# Altium footprint library elk-pi-Sika_revb.PcbLib: 102 footprints (part 2 of 7)
Each footprint in its own frame and in the unit in brackets; x right, y up, seen from the top. Pads: shape width x height; smd on the part's side, far side on the other; paste and mask are expansions set on the pad; w line width, h text height; cw(c..) or ccw(c..) is an arc to the next point about the centre after c.
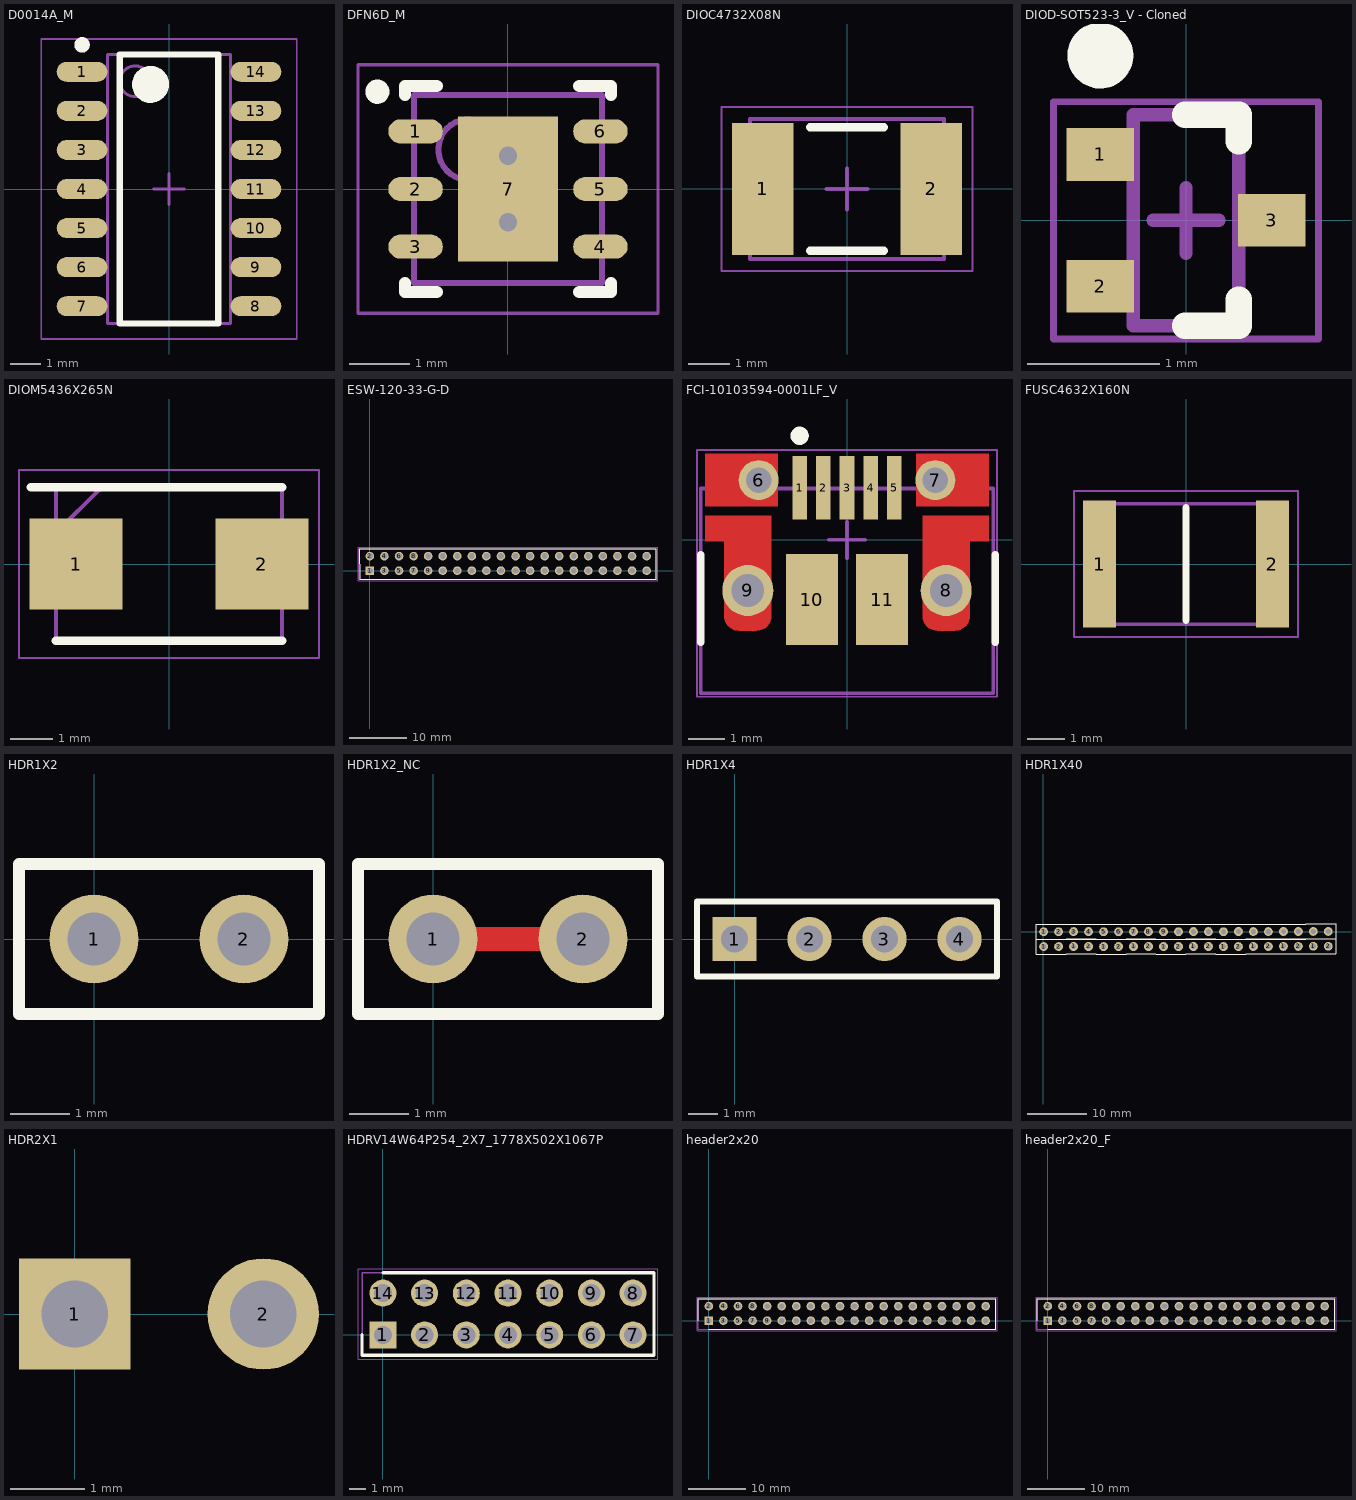
[diagram p1: the footprints below, top view; thin cyan lines are the x and y axes]

## D0014A_M [mm] "SOIC, 14-Leads, Body 8.75x4mm, Pitch 1.27mm, IPC Low Density"
height 1.75
pads (14):
  oval 1.65x0.65 smd: 1(-2.825,3.81) 2(-2.825,2.54) 3(-2.825,1.27) 4(-2.825,0) 5(-2.825,-1.27) 6(-2.825,-2.54) 7(-2.825,-3.81) 8(2.825,-3.81) 9(2.825,-2.54) 10(2.825,-1.27) 11(2.825,0) 12(2.825,1.27) 13(2.825,2.54) 14(2.825,3.81)
Top Overlay:
  circle w0.6: c-0.6,3.4 r0.3
  circle w0.25: c-2.825,4.685 r0.125
  lines w0.2: -1.6,-4.375 1.6,-4.375 1.6,4.375 -1.6,4.375 -1.6,-4.375
Mechanical 13:
  circle w0.1: c-1.1,3.5 r0.5
  lines w0.1: -2,-4.375 2,-4.375 2,4.375 -2,4.375 -2,-4.375
Mechanical 15:
  lines w0.05: -4.15,-4.875 4.15,-4.875 4.15,4.875 -4.15,4.875 -4.15,-4.875
  lines w0.1: -0.5,0 0.5,0 ; 0,-0.5 0,0.5
3D body "SOIC-14akaD0014AakaM14A.stp": height 1.59, standoff -0.01, extent -3.023,-4.318 3.022,4.318

## DFN6D_M [mm]
pads (7):
  oval 0.9x0.4 smd: 1(-1.525,0.95) 2(-1.525,0) 3(-1.525,-0.95) 4(1.525,-0.95) 5(1.525,0) 6(1.525,0.95)
  rect 1.65x2.4 smd: 7(0,0)
via 0,0.55 diameter 0.7 hole 0.3
via 0,-0.55 diameter 0.7 hole 0.3
Top Overlay:
  circle w0.2: c-2.156,1.605 r0.1
  lines w0.2: -1.7,-1.55 -1.7,-1.7 -1.175,-1.7 ; -1.7,1.55 -1.7,1.7 -1.175,1.7 ; 1.175,-1.7 1.7,-1.7 1.7,-1.55 ; 1.175,1.7 1.7,1.7 1.7,1.55
Mechanical 13:
  circle w0.1: c-0.65,0.65 r0.5
  lines w0.1: -1.55,-1.55 -1.55,1.55 1.55,1.55 1.55,-1.55 -1.55,-1.55
Mechanical 15:
  lines w0.05: -2.475,-2.05 -2.475,2.05 2.475,2.05 2.475,-2.05 -2.475,-2.05
  lines w0.1: -0.5,0 0.5,0 ; 0,-0.5 0,0.5
3D body: height 0.95, standoff 0, extent -1.55,-1.55 1.55,1.55

## DIOC4732X08N [mm] "Chip Diode, 2-Leads, Body 4,73x3,24mm, IPC Medium Density"
height 0.85
pads (2):
  rect 1.5x3.2 smd: 1(-2.05,0) 2(2.05,0)
Top Overlay:
  lines w0.2: -0.9,-1.5 0.9,-1.5 ; -0.9,1.5 0.9,1.5
Mechanical 13:
  lines w0.1: -2.365,-1.705 -2.365,1.705 2.365,1.705 2.365,-1.705 -2.365,-1.705
Mechanical 15:
  lines w0.05: -3.05,-2 -3.05,2 3.05,2 3.05,-2 -3.05,-2
  lines w0.1: -0.5,0 0.5,0 ; 0,-0.5 0,0.5
3D body: height 0.85, standoff 0, extent -2.015,-1.705 2.015,1.705
3D body: height 0.85, standoff 0, extent -2.365,-1.705 -2.015,1.705
3D body: height 0.85, standoff 0, extent 2.015,-1.705 2.365,1.705

## DIOD-SOT523-3_V - Cloned [mm] "SOT523, 3-Leads, Body 1.6x0.8mm, Pitch 0.50mm"
height 0.862
pads (3):
  rect 0.51x0.4 smd: 1(-0.65,0.5) 2(-0.65,-0.5) 3(0.65,0)
Top Overlay:
  circle w0.25: c-0.65,1.25 r0.125
  lines w0.2: -0.008,-0.8 0.4,-0.8 0.4,-0.6 ; -0.008,0.8 0.4,0.8 0.4,0.6
Mechanical 13:
  lines w0.1: -0.4,-0.8 0.4,-0.8 0.4,0.8 -0.4,0.8 -0.4,-0.8
Mechanical 15:
  lines w0.05: -1.005,-0.9 1.005,-0.9 1.005,0.9 -1.005,0.9 -1.005,-0.9
  lines w0.1: -0.25,0 0.25,0 ; 0,-0.25 0,0.25
3D body: height 0.86, standoff 0, extent -0.4,-0.8 0.4,0.8

## DIOM5436X265N [mm]
pads (2):
  rect 2.2x2.15 smd: 1(-2.2,0) 2(2.2,0)
Top Overlay:
  lines w0.2: -3.275,1.812 2.675,1.812 ; -2.675,-1.812 2.675,-1.812
Mechanical 15:
  lines w0.1: -2.675,0.738 -1.6,1.812 ; -2.675,-1.812 -2.675,1.812 2.675,1.812 2.675,-1.812 -2.675,-1.812
Mechanical 20:
  lines w0.05: -3.55,-2.225 -3.55,2.225 3.55,2.225 3.55,-2.225 -3.55,-2.225

## ESW-120-33-G-D [mm]
pads (40):
  rect 1.5x1.5 / inner round 1.5 / far side rect 1.5x1.5 hole 1: 1(0,0)
  round 1.5 hole 1: 2(0,2.54) 3(2.54,0) 4(2.54,2.54) 5(5.08,0) 6(5.08,2.54) 7(7.62,0) 8(7.62,2.54) 9(10.16,0) 10(10.16,2.54) 11(12.7,0) 12(12.7,2.54) 13(15.24,0) 14(15.24,2.54) 15(17.78,0) 16(17.78,2.54) 17(20.32,0) 18(20.32,2.54) 19(22.86,0) 20(22.86,2.54) 21(25.4,0) 22(25.4,2.54) 23(27.94,0) 24(27.94,2.54) 25(30.48,0) 26(30.48,2.54) 27(33.02,0) 28(33.02,2.54) 29(35.56,0) 30(35.56,2.54) 31(38.1,0) 32(38.1,2.54) 33(40.64,0) 34(40.64,2.54) 35(43.18,0) 36(43.18,2.54) 37(45.72,0) 38(45.72,2.54) 39(48.26,0) 40(48.26,2.54)
Top Overlay:
  lines w0.2: -1.82,3.81 49.98,3.81 49.98,-1.47 -1.8,-1.5 -1.82,3.81
Mechanical 15:
  lines w0.1: -1.82,-1.47 49.98,-1.47 49.98,3.81 -1.82,3.81 -1.82,-1.47
Mechanical 20:
  lines w0.05: -2.075,-1.735 -2.075,4.045 ; -2.07,4.055 50.23,4.055 ; -2.06,-1.725 50.24,-1.725 ; 50.25,-1.72 50.25,4.06
3D body "ESW-120-33-G-D.stp": height 15.89, standoff -2.53, extent -1.484,-1.315 49.824,3.765

## FCI-10103594-0001LF_V [mm]
pads (11):
  rect 0.4x1.75 smd: 1(-1.3,1.435) 2(-0.65,1.435) 3(0,1.435) 4(0.65,1.435) 5(1.3,1.435)
  round 1.1 hole 0.7: 6(-2.425,1.64) 7(2.425,1.64)
  round 1.4 hole 0.9: 8(2.725,-1.39) 9(-2.725,-1.39)
  rect 1.425x2.5 smd: 10(-0.963,-1.64) 11(0.963,-1.64)
Top Layer:
  region: 3.9,2.37 1.9,2.37 1.9,0.91 3.9,0.91
  rectangle: -3.9,0.91 -1.9,2.37
  region: 3.375,-0.04 3.375,-2.09 3.373,-2.129 3.369,-2.167 3.365,-2.185 3.359,-2.203 3.348,-2.239 3.329,-2.277 3.308,-2.312 3.284,-2.344 3.258,-2.374 3.227,-2.401 3.194,-2.426 3.158,-2.446 3.121,-2.464 3.08,-2.477 3.049,-2.483 3.012,-2.488 2.975,-2.49 2.475,-2.49 2.432,-2.488 2.391,-2.481 2.351,-2.471 2.312,-2.456 2.28,-2.439 2.249,-2.421 2.217,-2.396 2.19,-2.37 2.164,-2.342 2.143,-2.312 2.121,-2.277 2.105,-2.241 2.093,-2.209 2.088,-2.192 2.084,-2.175 2.08,-2.155 2.076,-2.134 2.075,-2.112 2.075,-2.09 2.075,-0.04 2.075,0.66 3.9,0.66 3.9,-0.04
  region: -3.375,-0.04 -3.375,-2.09 -3.373,-2.129 -3.369,-2.167 -3.365,-2.185 -3.359,-2.203 -3.348,-2.239 -3.329,-2.277 -3.308,-2.312 -3.284,-2.344 -3.258,-2.374 -3.227,-2.401 -3.194,-2.426 -3.158,-2.446 -3.121,-2.464 -3.08,-2.477 -3.049,-2.483 -3.012,-2.488 -2.975,-2.49 -2.475,-2.49 -2.432,-2.488 -2.391,-2.482 -2.351,-2.471 -2.312,-2.456 -2.28,-2.439 -2.249,-2.421 -2.217,-2.397 -2.19,-2.37 -2.164,-2.342 -2.143,-2.312 -2.121,-2.277 -2.105,-2.241 -2.093,-2.209 -2.088,-2.192 -2.084,-2.175 -2.08,-2.155 -2.076,-2.134 -2.075,-2.112 -2.075,-2.09 -2.075,-0.04 -2.075,0.66 -3.9,0.66 -3.9,-0.04
Top Overlay:
  circle w0.25: c-1.3,2.86 r0.125
  lines w0.2: -4.02,-2.81 -4.02,-0.41 ; 4.073,-2.81 4.073,-0.41
Mechanical 13:
  lines w0.1: -4.02,-4.21 -4.02,1.41 4.02,1.41 4.02,-4.21 -4.02,-4.21
Mechanical 15:
  lines w0.05: -4.12,-4.31 -4.12,2.47 4.12,2.47 4.12,-4.31 -4.12,-4.31
  lines w0.1: -0.5,0 0.5,0 ; 0,-0.5 0,0.5
3D body: height 2.9, standoff -0.7, extent -4.02,-4.149 4.02,1.884

## FUSC4632X160N [mm]
pads (2):
  rect 0.89x3.43 smd: 1(-2.325,0) 2(2.325,0)
Top Overlay:
  lines w0.2: 0,-1.52 0,1.52
Mechanical 15:
  lines w0.1: -2.3,-1.62 2.3,-1.62 2.3,1.62 -2.3,1.62 -2.3,-1.62
Mechanical 20:
  lines w0.05: -3.02,-1.965 3.02,-1.965 3.02,1.965 -3.02,1.965 -3.02,-1.965

## HDR1X2 [mm]
pads (2):
  round 1.5 hole 0.9: 1(0,0) 2(2.54,0)
Top Overlay:
  lines w0.2: -1.27,-1.27 -1.27,1.27 3.81,1.27 3.81,-1.27 -1.27,-1.27

## HDR1X2_NC [mm]
pads (2):
  round 1.5 hole 0.9: 1(0,0) 2(2.54,0)
Top Layer:
  lines w0.4: 0,0 2.54,0
Top Overlay:
  lines w0.2: -1.27,-1.27 -1.27,1.27 3.81,1.27 3.81,-1.27 -1.27,-1.27

## HDR1X4 [mm]
pads (4):
  rect 1.5x1.5 hole 0.9: 1(0,0)
  round 1.5 hole 0.9: 2(2.54,0) 3(5.08,0) 4(7.62,0)
Top Overlay:
  lines w0.2: -1.27,-1.27 8.89,-1.27 8.89,1.27 -1.27,1.27 -1.27,-1.27
3D body "female_header_a-bl254-eg-g04d.stp": height 8.5, standoff -3.2, extent -1.4,-1.25 9.01,1.25

## HDR1X40 [mm]
pads (40):
  round 1.5 hole 0.9: 1(0.025,-2.55) 1(0.025,-0.025) 1(5.106,-2.538) 1(10.2,-2.55) 1(15.281,-2.538) 1(20.375,-2.55) 1(25.456,-2.538) 1(30.55,-2.55) 1(35.631,-2.538) 1(40.725,-2.525) 1(45.806,-2.513) 2(2.565,-2.55) 2(2.565,-0.025) 2(7.646,-2.538) 2(12.74,-2.55) 2(17.821,-2.538) 2(22.915,-2.55) 2(27.996,-2.538) 2(33.09,-2.55) 2(38.171,-2.538) 2(43.265,-2.525) 2(48.346,-2.513) 3(5.106,-0.013) 4(7.646,-0.013) 5(10.2,-0.025) 6(12.74,-0.025) 7(15.281,-0.013) 8(17.821,-0.013) 9(20.375,-0.025) 10(22.915,-0.025) 11(25.456,-0.013) 12(27.996,-0.013) 13(30.55,-0.025) 14(33.09,0) 15(35.631,-0.013) 16(38.171,-0.013) 17(40.725,0) 18(43.265,0) 19(45.806,0.012) 20(48.346,0.012)
Top Overlay:
  lines w0.2: -1.27,-1.295 3.81,-1.295 ; -1.245,-1.295 -1.245,1.245 3.835,1.245 ; 3.811,-1.283 8.891,-1.283 ; 3.835,-3.82 -1.245,-3.82 -1.245,-1.28 3.835,-1.28 ; 3.836,-3.808 8.916,-3.808 ; 3.836,-1.268 8.916,-1.268 ; 3.836,1.257 8.916,1.257 ; 8.905,-1.295 13.985,-1.295 ; 8.93,-3.82 14.01,-3.82 ; 8.93,-1.28 14.01,-1.28 ; 8.93,1.245 14.01,1.245 ; 13.986,-1.283 19.066,-1.283 ; 14.011,-3.808 19.091,-3.808 ; 14.011,-1.268 19.091,-1.268 ; 14.011,1.257 19.091,1.257 ; 19.08,-1.295 24.16,-1.295 ; 19.105,-3.82 24.185,-3.82 ; 19.105,-1.28 24.185,-1.28 ; 19.105,1.245 24.185,1.245 ; 24.161,-1.283 29.241,-1.283 ; 24.186,-3.808 29.266,-3.808 ; 24.186,-1.268 29.266,-1.268 ; 24.186,1.257 29.266,1.257 ; 29.255,-1.295 34.335,-1.295 ; 29.28,-3.82 34.36,-3.82 ; 29.28,-1.28 34.36,-1.28 ; 29.28,1.245 34.36,1.245 ; 34.336,-1.283 39.416,-1.283 ; 34.361,-3.808 39.441,-3.808 ; 34.361,-1.268 39.441,-1.268 ; 34.361,1.257 39.441,1.257 ; 39.43,-1.27 44.51,-1.27 ; 39.455,-3.795 44.535,-3.795 ; 39.455,-1.255 44.535,-1.255 ; 39.455,1.27 44.535,1.27 ; 44.511,-1.258 49.591,-1.258 ; 44.536,-3.783 49.616,-3.783 ; 44.536,-1.243 49.616,-1.243 ; 44.536,1.282 49.616,1.282 ; 49.65,-3.783 49.65,-1.243 ; 49.65,-1.258 49.65,1.282

## HDR2X1 [mm]
pads (2):
  rect 1.5x1.5 hole 0.9: 1(0,0)
  round 1.5 hole 0.9: 2(2.54,0)

## HDRV14W64P254_2X7_1778X502X1067P [mm]
pads (14):
  rect 1.65x1.65 / inner round 1.65 / far side rect 1.65x1.65 hole 1.1: 1(0,0)
  round 1.65 hole 1.1: 2(2.54,0) 3(5.08,0) 4(7.62,0) 5(10.16,0) 6(12.7,0) 7(15.24,0) 8(15.24,2.54) 9(12.7,2.54) 10(10.16,2.54) 11(7.62,2.54) 12(5.08,2.54) 13(2.54,2.54) 14(0,2.54)
Top Overlay:
  lines w0.2: -1.27,0 -1.27,-1.24 16.51,-1.24 16.51,3.78 0,3.78
Mechanical 15:
  lines w0.1: -1.27,-1.24 16.51,-1.24 16.51,3.78 -1.27,3.78 -1.27,-1.24
Mechanical 20:
  lines w0.05: -1.52,-1.49 16.76,-1.49 16.76,4.03 -1.52,4.03 -1.52,-1.49
3D body "DS1021-2x7SF11.stp": height 8.6, standoff -3, extent -1.27,-1.23 16.51,3.77

## header2x20 [mm]
pads (40):
  rect 1.5x1.5 / inner round 1.5 / far side rect 1.5x1.5 hole 1: 1(0,0)
  round 1.5 hole 1: 2(0,2.54) 3(2.54,0) 4(2.54,2.54) 5(5.08,0) 6(5.08,2.54) 7(7.62,0) 8(7.62,2.54) 9(10.16,0) 10(10.16,2.54) 11(12.7,0) 12(12.7,2.54) 13(15.24,0) 14(15.24,2.54) 15(17.78,0) 16(17.78,2.54) 17(20.32,0) 18(20.32,2.54) 19(22.86,0) 20(22.86,2.54) 21(25.4,0) 22(25.4,2.54) 23(27.94,0) 24(27.94,2.54) 25(30.48,0) 26(30.48,2.54) 27(33.02,0) 28(33.02,2.54) 29(35.56,0) 30(35.56,2.54) 31(38.1,0) 32(38.1,2.54) 33(40.64,0) 34(40.64,2.54) 35(43.18,0) 36(43.18,2.54) 37(45.72,0) 38(45.72,2.54) 39(48.26,0) 40(48.26,2.54)
Top Overlay:
  lines w0.2: -1.82,0 -1.82,3.81 49.98,3.81 49.98,-1.47 0,-1.47
Mechanical 15:
  lines w0.1: -1.82,-1.47 49.98,-1.47 49.98,3.81 -1.82,3.81 -1.82,-1.47
Mechanical 20:
  lines w0.05: -2.07,-1.72 50.23,-1.72 50.23,4.06 -2.07,4.06 -2.07,-1.72
3D body "m20-9982045_asm.stp": height 8.65, standoff -3.03, extent -1.3,-1.34 49.5,3.74

## header2x20_F [mm]
pads (40):
  rect 1.5x1.5 / inner round 1.5 / far side rect 1.5x1.5 hole 1: 1(0,0)
  round 1.5 hole 1: 2(0,2.54) 3(2.54,0) 4(2.54,2.54) 5(5.08,0) 6(5.08,2.54) 7(7.62,0) 8(7.62,2.54) 9(10.16,0) 10(10.16,2.54) 11(12.7,0) 12(12.7,2.54) 13(15.24,0) 14(15.24,2.54) 15(17.78,0) 16(17.78,2.54) 17(20.32,0) 18(20.32,2.54) 19(22.86,0) 20(22.86,2.54) 21(25.4,0) 22(25.4,2.54) 23(27.94,0) 24(27.94,2.54) 25(30.48,0) 26(30.48,2.54) 27(33.02,0) 28(33.02,2.54) 29(35.56,0) 30(35.56,2.54) 31(38.1,0) 32(38.1,2.54) 33(40.64,0) 34(40.64,2.54) 35(43.18,0) 36(43.18,2.54) 37(45.72,0) 38(45.72,2.54) 39(48.26,0) 40(48.26,2.54)
Top Overlay:
  lines w0.2: -1.82,0 -1.82,3.81 49.98,3.81 49.98,-1.47 0,-1.47
Mechanical 15:
  lines w0.1: -1.82,-1.47 -1.82,3.81 49.98,3.81 49.98,-1.47 -1.82,-1.47
Mechanical 20:
  lines w0.05: -2.07,-1.72 -2.07,4.06 50.23,4.06 50.23,-1.72 -2.07,-1.72
3D body "m20-7832046_asm.stp": height 8.31, standoff -3.19, extent -1.6,-1.35 49.6,3.69